# Altium footprint library AltiumLibrary.PcbLib: 90 footprints (part 5 of 6)
Each footprint in its own frame and in the unit in brackets; x right, y up, seen from the top. Pads: shape width x height; smd on the part's side, far side on the other; paste and mask are expansions set on the pad; w line width, h text height; cw(c..) or ccw(c..) is an arc to the next point about the centre after c.
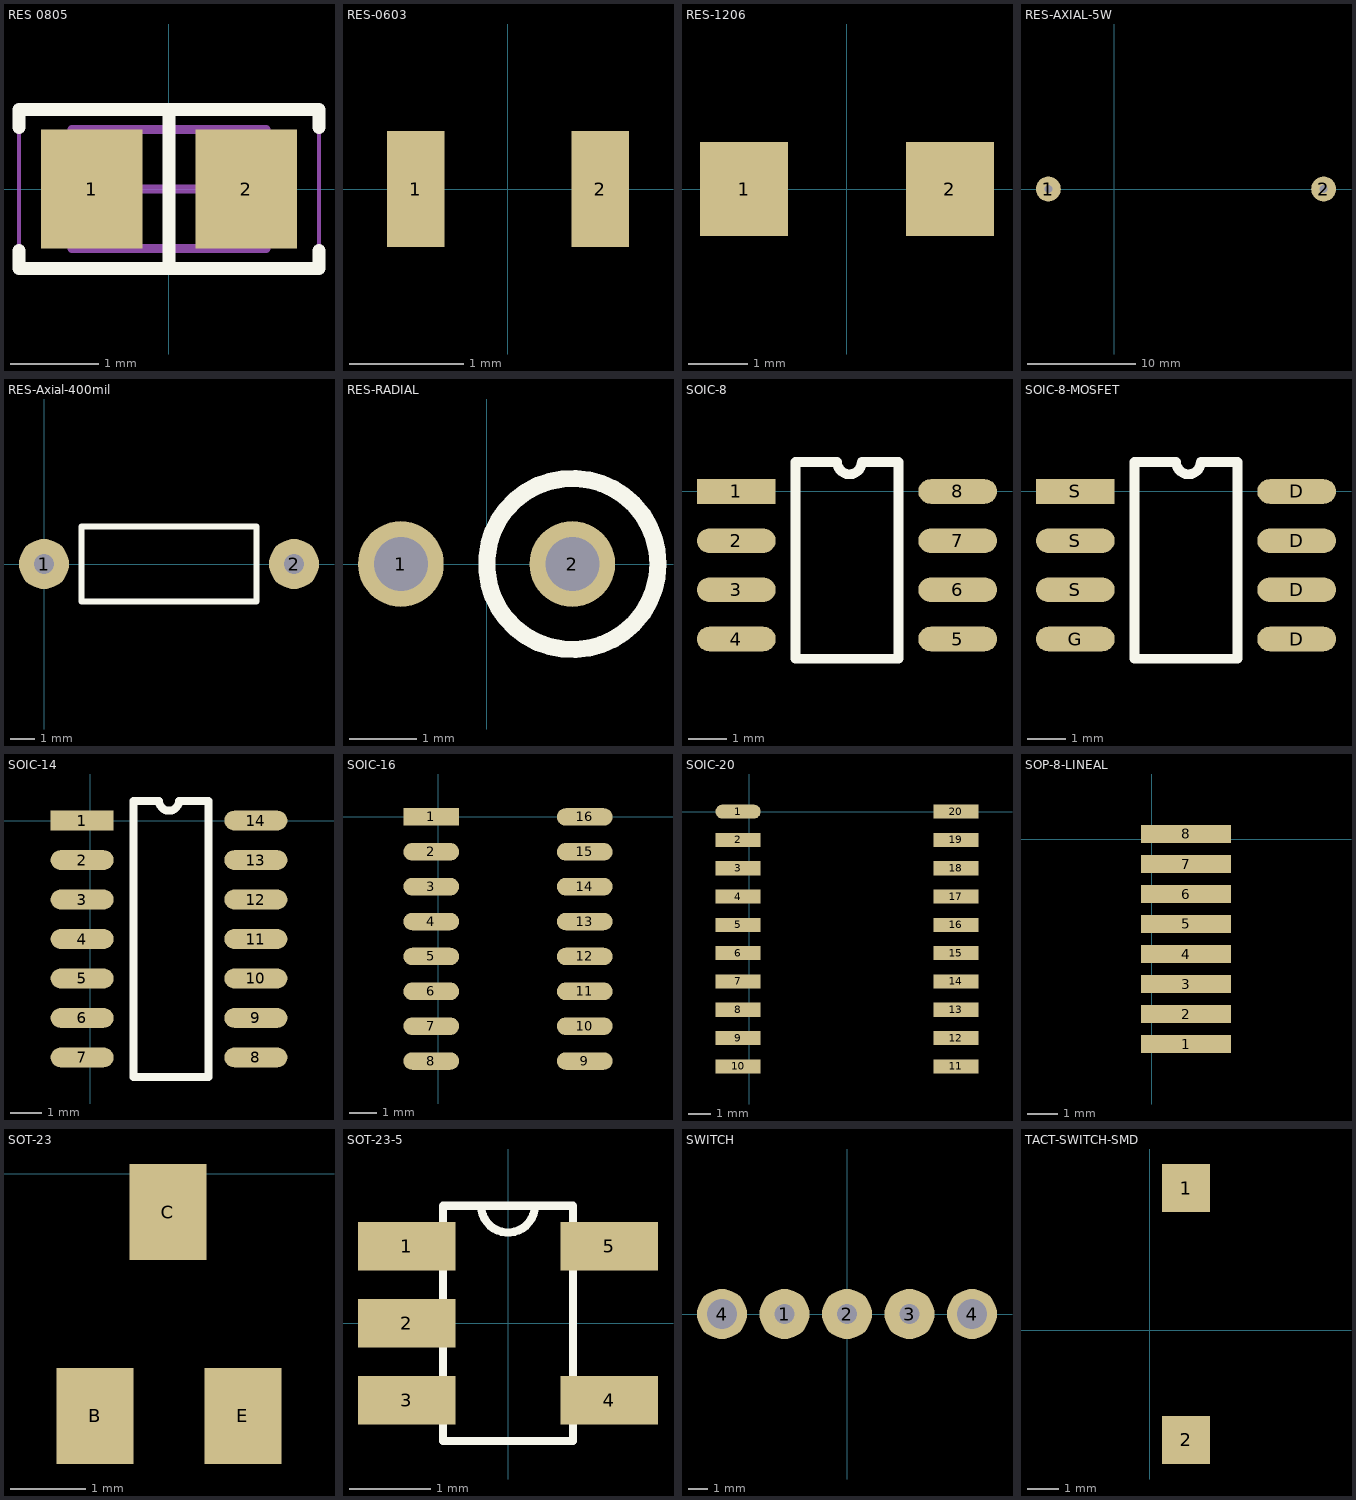
[diagram p4: the footprints below, top view; thin cyan lines are the x and y axes]

## RES 0805 [mm] "Chip"
height 0.7
pads (2):
  rect 1.15x1.35 smd: 1(-0.875,0) 2(0.875,0)
Top Overlay:
  lines w0.15: -1.7,-0.7 -1.7,-0.9 1.7,-0.9 1.7,-0.7 ; -1.7,0.7 -1.7,0.9 1.7,0.9 1.7,0.7 ; 0,-0.9 0,0.9
Mechanical 13:
  lines w0.1: -1.1,-0.675 -1.1,0.675 1.1,0.675 1.1,-0.675 -1.1,-0.675
Mechanical 15:
  lines w0.05: -1.7,-0.95 -1.7,0.95 1.7,0.95 1.7,-0.95 -1.7,-0.95
  lines w0.1: -0.5,0 0.5,0 ; 0,-0.5 0,0.5
3D body "0805 resistor.STEP": height 0.6, standoff 0, extent -0.95,-0.625 1.05,0.625

## RES-0603 [mil]
pads (2):
  rect 20x40 smd: 1(-31.89,0) 2(31.89,0)
3D body "User Library-0603 SMD Resistor.step": height 11.89, standoff 0, extent -31.49,-15.74 31.5,15.75

## RES-1206 [mm]
pads (2):
  rect 1.5x1.6 smd: 1(-1.75,0) 2(1.75,0)
3D body "User Library-SMD RESISTOR-1.step": height 0.68, standoff 0.08, extent -1.6,-0.762 1.6,0.838

## RES-AXIAL-5W [mil]
pads (2):
  round 90 hole 30: 1(-240,0) 2(760,0)
3D body "User Library-Resistor 5W Length 22mm, pitch 1in.step": height 357.17, standoff -211.32, extent -255.74,-187 775.75,187.01

## RES-Axial-400mil [mil]
pads (2):
  round 80 hole 31.5: 1(0,0) 2(400,0)
Top Overlay:
  lines w10: 60,-60 60,0 60,60 340,60 340,-60 60,-60
3D body "SW3dPS-resistor - fixed.STEP": height 94, standoff -110, extent -12,-44 410,44

## RES-RADIAL [mm]
pads (2):
  round 1.27 hole 0.8: 1(-1.27,0) 2(1.27,0)
Top Overlay:
  circle w0.254: c1.27,0 r1.27
3D body: height 0, standoff 0, extent -2.54,-1.27 2.54,1.27

## SOIC-8 [mil]
pads (8):
  rect 80x25 smd: 1(215,0)
  oval 80x25 smd: 2(215,-50) 3(215,-100) 4(215,-150) 5(440,-150) 6(440,-100) 7(440,-50) 8(440,0)
Top Overlay:
  lines w10: 275,-170 380,-170 380,30 342.5,30 cw(c330,30) 317.5,30 275,30 275,-170
3D body "User Library-SOIC-8-1.step": height 68.9, standoff 0, extent 211.9,-171.46 448.12,21.46

## SOIC-8-MOSFET [mil]
pads (8):
  oval 80x25 smd: D(440,-150) D(440,-100) D(440,-50) D(440,0) G(215,-150) S(215,-100) S(215,-50)
  rect 80x25 smd: S(215,0)
Top Overlay:
  lines w10: 275,-170 275,30 317.5,30 ccw(c330,30) 342.5,30 380,30 380,-170 275,-170
3D body "User Library-SOIC-8-1.step": height 68.9, standoff 0, extent 211.9,-171.46 448.12,21.46

## SOIC-14 [mil]
pads (14):
  rect 80x25 smd: 1(-10,0)
  oval 80x25 smd: 2(-10,-50) 3(-10,-100) 4(-10,-150) 5(-10,-200) 6(-10,-250) 7(-10,-300) 8(210,-300) 9(210,-250) 10(210,-200) 11(210,-150) 12(210,-100) 13(210,-50) 14(210,0)
Top Overlay:
  lines w10: 55,-325 55,25 87.5,25 ccw(c100,25) 112.5,25 150,25 150,-325 55,-325
3D body "User Library-SOIC14-150.step": height 68.9, standoff 0, extent -19.16,-318.31 209.18,18.31

## SOIC-16 [mil]
pads (16):
  rect 80x25 smd: 1(-10,0)
  oval 80x25 smd: 2(-10,-50) 3(-10,-100) 4(-10,-150) 5(-10,-200) 6(-10,-250) 7(-10,-300) 8(-10,-350) 9(210,-350) 10(210,-300) 11(210,-250) 12(210,-200) 13(210,-150) 14(210,-100) 15(210,-50) 16(210,0)
3D body "User Library-SOIC-16-1.step": height 55.12, standoff 0, extent -18.1,-369.88 218.12,19.89

## SOIC-20 [mil]
pads (20):
  oval 80x25 smd: 1(-20,0)
  rect 80x25 smd: 2(-20,-50) 3(-20,-100) 4(-20,-150) 5(-20,-200) 6(-20,-250) 7(-20,-300) 8(-20,-350) 9(-20,-400) 10(-20,-450) 11(365,-450) 12(365,-400) 13(365,-350) 14(365,-300) 15(365,-250) 16(365,-200) 17(365,-150) 18(365,-100) 19(365,-50) 20(365,0)
3D body "User Library-SOIC20-300.step": height 106.33, standoff 2, extent -30.51,-475 375,28.94

## SOP-8-LINEAL [mm]
pads (8):
  rect 3x0.6 all layers, no hole: 1(1.143,-6.826) 2(1.143,-5.826) 3(1.143,-4.826) 4(1.143,-3.826) 5(1.143,-2.826) 6(1.143,-1.826) 7(1.143,-0.826) 8(1.143,0.174)
3D body "SW3dPS-TFDU4101.STEP": height 4.33, standoff 0.03, extent -0.389,-8.23 4.928,1.676

## SOT-23 [mil]
pads (3):
  rect 40x50 smd: B(237.2,-125.98) C(275,-20) E(313.98,-125.98)
3D body "User Library-3-lead sot23-3.step": height 37.59, standoff -2.57, extent 218.11,-124.01 333.08,-26.53

## SOT-23-5 [mm]
pads (5):
  rect 1.2x0.6 smd: 1(-1.25,0.95) 2(-1.25,0) 3(-1.25,-0.95) 4(1.25,-0.95) 5(1.25,0.95)
Top Overlay:
  lines w0.1: -0.8,-1.45 0.8,-1.45 0.8,1.45 -0.8,1.45 -0.8,-1.45
  lines w0.102: -0.33,1.45 ccw(c0,1.45) 0.33,1.45
3D body "LP2985AIM5-3.6_NOPB.stp": height 1.45, standoff 0, extent -1.4,-1.45 1.4,1.45

## SWITCH [mm]
pads (5):
  round 2.54 hole 1: 1(-3.175,0) 2(0,0) 3(3.175,0)
  round 2.54 hole 1.5: 4(-6.35,0) 4(6.35,0)
3D body "User Library-SLB12814.STEP": height 9.65, standoff -2.6, extent -7,-3.1 7,3.1

## TACT-SWITCH-SMD [mil]
pads (2):
  rect 60x60 smd: 1(45,177.49) 2(45,-137.48)
3D body "User Library-Tact switch 1181_3.step": height 94.49, standoff -3.94, extent -25.86,-137.48 115.87,177.49